# Altium footprint library Shield_PCB_LIB.PcbLib: 10 footprints
Each footprint in its own frame and in the unit in brackets; x right, y up, seen from the top. Pads: shape width x height; smd on the part's side, far side on the other; paste and mask are expansions set on the pad; w line width, h text height; cw(c..) or ccw(c..) is an arc to the next point about the centre after c.
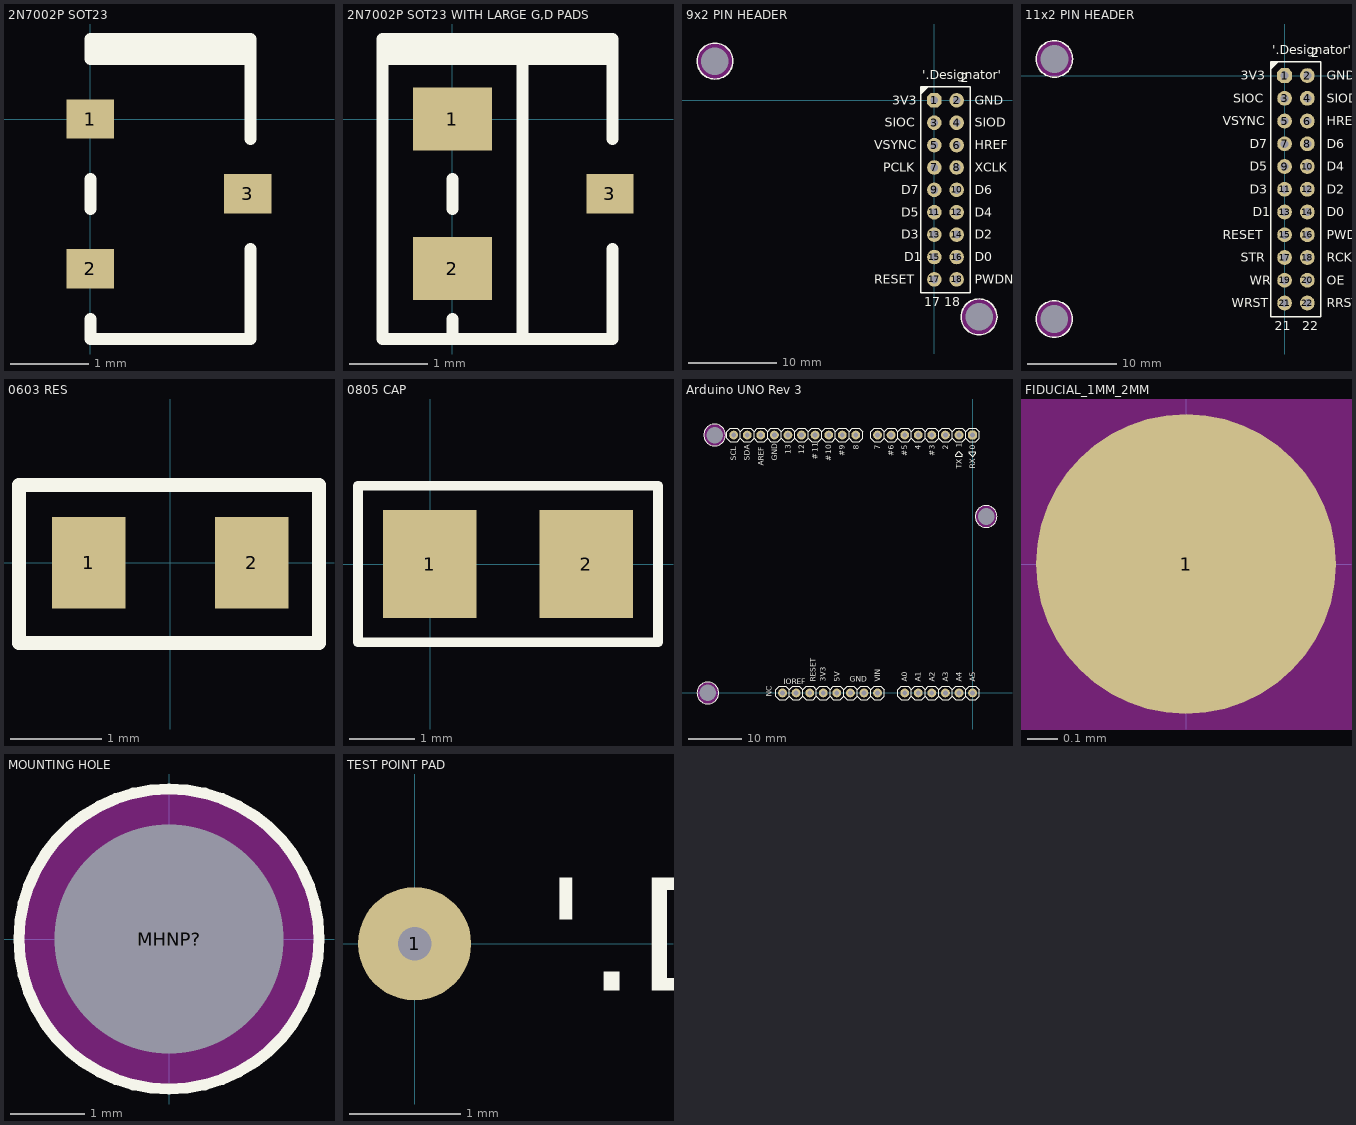
[diagram p0: the footprints below, top view; thin cyan lines are the x and y axes]

## 2N7002P SOT23 [mm] "NMOS 2N7002P in SOT23 package"
pads (3):
  rect 0.6x0.5 smd: 1(0,0) 2(0,-1.9) 3(2,-0.95)
Top Overlay:
  rectangle: 0,0.762 2.032,1.016
  lines w0.1: 0,1.016 0.229,1.016
  lines w0.152: 0,-2.54 0,-2.794 2.032,-2.794 2.032,-1.651 ; 0,-1.143 0,-0.762 ; 2.032,-0.254 2.032,1.016 0,1.016 0,0.762 2.032,0.762
3D body "2N7002P.STEP": height 1.12, standoff 0.01, extent -0.259,-2.44 2.241,0.56

## 2N7002P SOT23 WITH LARGE G,D PADS [mm] "NMOS 2N7002P in SOT23 package"
pads (3):
  rect 1x0.8 smd: 1(0,0) 2(0,-1.9)
  rect 0.6x0.5 smd: 3(2,-0.95)
Top Overlay:
  rectangle: -0.889,0.762 2.032,1.016
  lines w0.1: 0,1.016 0.229,1.016
  lines w0.152: 0,-2.54 0,-2.794 ; 0,-1.143 0,-0.762 ; 0.889,-2.54 0.889,-2.776 0.889,0.762 ; 2.032,-1.651 2.032,-2.794 0,-2.794 ; 2.032,-0.254 2.032,1.016 -0.889,1.016 -0.889,0.762 ; 2.032,0.762 -0.889,0.762 ; -0.889,0.762 -0.889,-2.794 0,-2.794
3D body "2N7002P.STEP": height 1.12, standoff 0.01, extent -0.259,-2.44 2.241,0.56

## 9x2 PIN HEADER [mil] "9x2 pin header THT100mil x 100mil"
pads (22):
  oct 65x65 hole 35: 1(0,0)
  round 65 hole 35: 2(100,0) 3(0,-100) 4(100,-100) 5(0,-200) 6(100,-200) 7(0,-300) 8(100,-300) 9(0,-400) 10(100,-400) 11(0,-500) 12(100,-500) 13(0,-600) 14(100,-600) 15(0,-700) 16(100,-700) 17(0,-800) 18(100,-800)
  round 60 hole 122.05 unplated: MHNP?(-980,175) MHNP?(200.11,-967.19)
  round 80 hole 122.05: ""(-980,175) ""(200.11,-967.19)
Top Overlay:
  circle w6: c-980,175 r80
  circle w6: c200.11,-967.19 r80
  region: -60,30 -30,60 -60,60
  lines w6: -60,30 -30,60 ; -60,30 -60,-860 160,-860 160,60 -30,60 ; -60,30 -60,60 -30,60 ; -60,30 -30,60
  text "GND" at 181,-19 h40
  text "SIOD" at 181,-119 h40
  text "HREF" at 181,-219 h40
  text "XCLK" at 181,-319 h40
  text "D6" at 181,-419 h40
  text "D4" at 181,-519 h40
  text "D2" at 181,-619 h40
  text "D0" at 181,-719 h40
  text "PWDN" at 181,-819 h40
  text "17" at -44,-919 h40
  text "2" at 117.34,81 h40
  text "18" at 44.02,-919 h40
  text "'.Designator'" at -54,94.33 h40
  text "3V3" at -187.63,-19 h40
  text "SIOC" at -220.95,-119 h40
  text "VSYNC" at -267.61,-219 h40
  text "PCLK" at -227.62,-319 h40
  text "D7" at -147.65,-419 h40
  text "D5" at -147.65,-519 h40
  text "D3" at -147.65,-619 h40
  text "D1" at -134.32,-719 h40
  text "RESET" at -267.61,-819 h40
Bottom Overlay:
  circle w6: c-980,175 r80
  circle w6: c200.11,-967.19 r80
  region: -60,30 -30,60 -60,60
  lines w6: -60,30 -60,-860 160,-860 160,60 -30,60 ; -60,30 -30,60 ; -60,30 -60,60 -30,60 ; -60,30 -30,60
  text "17" at 15.98,-919 h40
  text "RESET" at -81,-819 h40
  text "D1" at -81,-719 h40
  text "D3" at -81,-619 h40
  text "D5" at -81,-519 h40
  text "D7" at -81,-419 h40
  text "PCLK" at -75,-325 h40
  text "VSYNC" at -81,-219 h40
  text "SIOC" at -81,-119 h40
  text "3V3" at -81,-19 h40
  text "18" at 104,-919 h40
  text "PWDN" at 327.62,-819 h40
  text "D0" at 247.65,-719 h40
  text "D2" at 247.65,-619 h40
  text "D4" at 247.65,-519 h40
  text "D6" at 247.65,-419 h40
  text "XCLK" at 327.62,-319 h40
  text "HREF" at 327.62,-219 h40
  text "SIOD" at 320.95,-119 h40
  text "GND" at 287.63,-19 h40
  text "2" at 150,75 h40
  text "'.Designator'" at 24,94.33 h40
Keep-Out Layer:
  circle w80: c-980,175 r40
  circle w80: c200.11,-967.19 r40
3D body "OV7670_retraida.STEP": height 1297.83, standoff 81.3, extent -1078.73,-1066.65 299.23,271.94
3D body "FEMALE_THT_9X2_names.stp": height 334.65, standoff -96.46, extent -48.42,-855.84 148.43,54
3D body "User Library-MADA-12.step": height 618.11, standoff -145.67, extent -1069.55,83.45 -888.45,264.55
3D body "User Library-MADA-12.step": height 618.11, standoff -145.67, extent 112.45,-1059.55 293.55,-878.45

## 11x2 PIN HEADER [mil] "11x2 pin header THT100mil x 100mil"
pads (26):
  oct 65x65 hole 35: 1(0,0)
  round 65 hole 35: 2(100,0) 3(0,-100) 4(100,-100) 5(0,-200) 6(100,-200) 7(0,-300) 8(100,-300) 9(0,-400) 10(100,-400) 11(0,-500) 12(100,-500) 13(0,-600) 14(100,-600) 15(0,-700) 16(100,-700) 17(0,-800) 18(100,-800) 19(0,-900) 20(100,-900) 21(0,-1000) 22(100,-1000)
  round 60 hole 122.05 unplated: MHNP?(-1012.89,-1070.19) MHNP?(-1012,73)
  round 80 hole 122.05 unplated: ""(-1012.89,-1070.19) ""(-1012,73)
Top Overlay:
  circle w6: c-1012,73 r80
  circle w6: c-1012.89,-1070.19 r80
  region: -60,30 -30,60 -60,60
  lines w6: -60,30 -60,-1060 160,-1060 160,60 -30,60 ; -60,30 -30,60 ; -60,30 -60,60 -30,60
  text "'.Designator'" at -54,94.33 h40
  text "22" at 77.35,-1119 h40
  text "21" at -44,-1119 h40
  text "STR" at -192.63,-819 h40
  text "WRST" at -232.62,-1019 h40
  text "RRST" at 186,-1019 h40
  text "OE" at 186,-919 h40
  text "RESET" at -272.61,-719 h40
  text "D2" at 186,-519 h40
  text "D0" at 186,-619 h40
  text "WR" at -152.65,-919 h40
  text "D3" at -152.65,-519 h40
  text "D1" at -139.32,-619 h40
  text "RCK" at 186,-819 h40
  text "PWDN" at 186,-719 h40
  text "D6" at 186,-319 h40
  text "D4" at 186,-419 h40
  text "D5" at -152.65,-419 h40
  text "D7" at -152.65,-319 h40
  text "VSYNC" at -272.61,-219 h40
  text "HREF" at 186,-219 h40
  text "SIOC" at -225.95,-119 h40
  text "GND" at 186,-19 h40
  text "SIOD" at 186,-119 h40
  text "3V3" at -192.63,-19 h40
  text "2" at 117.34,81 h40
Bottom Overlay:
  circle w6: c-1012,73 r80
  circle w6: c-1012.89,-1070.19 r80
  region: -60,30 -30,60 -60,60
  lines w6: -60,30 -60,-1060 160,-1060 160,60 -30,60 ; -60,30 -60,60 -30,60 ; -60,30 -30,60
  text "'.Designator'" at 24,94.33 h40
  text "21" at 9.32,-1119 h40
  text "D3" at -86,-519 h40
  text "WRST" at -86,-1019 h40
  text "WR" at -86,-919 h40
  text "STR" at -86,-819 h40
  text "RESET" at -86,-719 h40
  text "D1" at -86,-619 h40
  text "D5" at -86,-419 h40
  text "D7" at -86,-319 h40
  text "VSYNC" at -86,-219 h40
  text "SIOC" at -86,-119 h40
  text "3V3" at -86,-19 h40
  text "22" at 144,-1119 h40
  text "RRST" at 332.62,-1019 h40
  text "D4" at 252.65,-419 h40
  text "OE" at 252.65,-919 h40
  text "RCK" at 292.63,-819 h40
  text "PWDN" at 332.62,-719 h40
  text "D0" at 252.65,-619 h40
  text "D2" at 252.65,-519 h40
  text "D6" at 252.65,-319 h40
  text "HREF" at 332.62,-219 h40
  text "2" at 144,81 h40
  text "SIOD" at 325.95,-119 h40
  text "GND" at 292.63,-19 h40
Keep-Out Layer:
  circle w80: c-1012,73 r40
  circle w80: c-1012.89,-1070.19 r40
3D body "User Library-MADA-12.step": height 618.11, standoff -145.67, extent -1099.55,-1160.55 -918.45,-979.45
3D body "User Library-MADA-12.step": height 618.11, standoff -145.67, extent -1100.55,-17.55 -919.45,163.55
3D body "FEMALE_THT_11X2_Names.STEP": height 334.65, standoff -96.46, extent -49.42,-1053.92 147.44,55.92
3D body "OV7670 FIFO BUFFER name.STEP": height 1534.38, standoff 81.62, extent -1109.98,-1169 267.97,169.59

## 0603 RES [mm]
pads (2):
  rect 0.8x1 smd: 1(-0.889,0) 2(0.889,0)
Top Overlay:
  lines w0.152: -1.651,-0.876 -1.651,0.849 1.624,0.849 1.624,-0.876 -1.651,-0.876
3D body "0603_RES.STEP": height 0.8, standoff 0, extent -1.23,-0.4 1.23,0.4

## 0805 CAP [mm]
pads (2):
  rect 1.44x1.66 smd: 1(-0.007,0) 2(2.393,0)
Top Overlay:
  lines w0.152: -1.107,-1.2 3.493,-1.2 3.493,1.2 -1.107,1.2 -1.107,-1.2
3D body "0805_CAP_3.stp": height 1, standoff 0, extent 0.05,-0.775 2.35,0.775

## Arduino UNO Rev 3 [mil] "Arduino UNO Rev 3 pinout as pads V2"
pads (35):
  round 65 hole 35: 3V3(-1100,0) 5V(-1000,0) A0(-500,0) A1(-400,0) A2(-300,0) A3(-200,0) A4/SDA(-1660,1900) A4/SDA(-100,0) A5/SCL(-1760,1900) A5/SCL(0,0) AREF(-1560,1900) D1(-100,1900) D2(-200,1900) D3(-300,1900) D4(-400,1900) D5(-500,1900) D6(-600,1900) D7(-700,1900) D8(-860,1900) D9(-960,1900) D10(-1060,1900) D11(-1160,1900) D12(-1260,1900) D13(-1360,1900) GND(-1460,1900) GND(-900,0) GND(-800,0) IOREF(-1300,0) NC(-1400,0) RESET(-1200,0) VIN(-700,0)
  oct 65x65 hole 35: D0(0,1900)
  round 60 hole 122.05 unplated: MH1(-1950,0) MH2(-1900,1900) MH3(100,1300)
Top Overlay:
  drawing of 244 lines, arcs and shapes, not listed
  text "RESET" at -1155.01,81 h40
  text "TX" at -80,1652.35 h40
  text "SCL" at -1739.99,1712.35 h40
  text "SDA" at -1640.01,1712.37 h40
  text "NC" at -1479.99,-29 h40
  text "IOREF" at -1389.97,66 h40
  text "5V" at -980,80.99 h40
  text "A0" at -480,80.99 h40
  text "AREF" at -1540,1672.37 h40
  text "GND" at -1440.01,1712.37 h40
  text "RX" at 19.99,1652.35 h40
  text "3V3" at -1080.01,81 h40
  text "A1" at -380,80.99 h40
  text "A2" at -280,80.99 h40
  text "A3" at -180,80.99 h40
  text "A4" at -80,80.99 h40
  text "A5" at 19.99,81 h40
  text "VIN" at -680,80.99 h40
  text "GND" at -903.32,81 h40
  text "#" at -1140.01,1717.34 h40
  text "#" at -1040.01,1707.34 h40
  text "#" at -480.01,1742.34 h40
  text "#" at -279.99,1742.32 h40
  text "#" at -580.01,1742.34 h40
  text "13" at -1340.01,1759.02 h40
  text "12" at -1240.01,1759.02 h40
  text "11" at -1140.01,1772.35 h40
  text "10" at -1040.01,1759.02 h40
  text "9" at -940.01,1792.34 h40
  text "8" at -840.01,1792.34 h40
  text "7" at -680.01,1792.34 h40
  text "6" at -580.01,1792.34 h40
  text "5" at -480.01,1792.34 h40
  text "4" at -380.01,1792.34 h40
  text "3" at -280.01,1792.34 h40
  text "2" at -179.99,1792.32 h40
  text "1" at -80.01,1805.67 h40
  text "0" at 19.99,1792.34 h40
  text "#" at -940.01,1742.34 h40
Bottom Overlay:
  drawing of 244 lines, arcs and shapes, not listed
  text "1" at -80.01,1819 h40
  text "0" at 19.99,1819 h40
  text "2" at -180.01,1819 h40
  text "3" at -280.01,1819 h40
  text "6" at -580.01,1819 h40
  text "4" at -380.01,1819 h40
  text "7" at -680.01,1819 h40
  text "5" at -480.01,1819 h40
  text "#" at -280.01,1769 h40
  text "#" at -480.01,1769 h40
  text "#" at -580.01,1769 h40
  text "RX" at 19.99,1719 h40
  text "TX" at -80,1718.99 h40
  text "A5" at 19.99,147.65 h40
  text "A3" at -180,147.64 h40
  text "A4" at -80,147.64 h40
  text "VIN" at -680,180.96 h40
  text "A2" at -280,147.64 h40
  text "A0" at -480,147.64 h40
  text "A1" at -380,134.31 h40
  text "9" at -939.99,1818.98 h40
  text "8" at -839.99,1818.98 h40
  text "11" at -1139.99,1818.98 h40
  text "10" at -1039.99,1818.98 h40
  text "#" at -939.99,1768.98 h40
  text "#" at -1039.99,1733.98 h40
  text "#" at -1139.99,1743.98 h40
  text "RESET" at -1155.01,267.61 h40
  text "12" at -1239.99,1818.98 h40
  text "13" at -1339.99,1818.98 h40
  text "SDA" at -1640.01,1819 h40
  text "SCL" at -1740.01,1819 h40
  text "AREF" at -1540,1818.99 h40
  text "IOREF" at -1210.03,66 h40
  text "5V" at -980,147.64 h40
  text "GND" at -796.68,81 h40
  text "3V3" at -1080.01,187.63 h40
  text "NC" at -1480,37.64 h40
  text "GND" at -1439.99,1818.98 h40
Keep-Out Layer:
  circle w80: c100,1300 r40
  circle w80: c-1950,0 r40
  circle w80: c-1900,1900 r40
Mechanical 3:
  region: -1750,1910 -1750,1890 -1770,1890 -1770,1910
  region: -1650,1910 -1650,1890 -1670,1890 -1670,1910
  region: -1310,-10 -1310,10 -1290,10 -1290,-10
  region: -1410,-10 -1410,10 -1390,10 -1390,-10
  region: -690,1910 -690,1890 -710,1890 -710,1910
  region: 10,1910 10,1890 -10,1890 -10,1910
  region: -90,1910 -90,1890 -110,1890 -110,1910
  region: -190,1910 -190,1890 -210,1890 -210,1910
  region: -290,1910 -290,1890 -310,1890 -310,1910
  region: -390,1910 -390,1890 -410,1890 -410,1910
  region: -490,1910 -490,1890 -510,1890 -510,1910
  region: -590,1910 -590,1890 -610,1890 -610,1910
  region: -1550,1910 -1550,1890 -1570,1890 -1570,1910
  region: -850,1910 -850,1890 -870,1890 -870,1910
  region: -950,1910 -950,1890 -970,1890 -970,1910
  region: -1050,1910 -1050,1890 -1070,1890 -1070,1910
  region: -1150,1910 -1150,1890 -1170,1890 -1170,1910
  region: -1250,1910 -1250,1890 -1270,1890 -1270,1910
  region: -1350,1910 -1350,1890 -1370,1890 -1370,1910
  region: -1450,1910 -1450,1890 -1470,1890 -1470,1910
  region: -110,-10 -110,10 -90,10 -90,-10
  region: -210,-10 -210,10 -190,10 -190,-10
  region: -310,-10 -310,10 -290,10 -290,-10
  region: -410,-10 -410,10 -390,10 -390,-10
  region: -510,-10 -510,10 -490,10 -490,-10
  region: -10,-10 -10,10 10,10 10,-10
  region: -810,-10 -810,10 -790,10 -790,-10
  region: -910,-10 -910,10 -890,10 -890,-10
  region: -1010,-10 -1010,10 -990,10 -990,-10
  region: -1110,-10 -1110,10 -1090,10 -1090,-10
  region: -1210,-10 -1210,10 -1190,10 -1190,-10
  region: -710,-10 -710,10 -690,10 -690,-10
3D body "6PIN.SLDPRT": height 57, standoff -383, extent -546.04,-46 45,46
3D body "8PIN.SLDPRT": height 57, standoff -383, extent -1446.26,-46 -655,46
3D body "8PIN.SLDPRT": height 57, standoff -383, extent -746.26,1854 45,1946
3D body "10PIN.SLDPRT": height 57, standoff -383, extent -1806.61,1854 -815,1946
3D body "ARDUINO_UNO_R3_1.STEP": height -108.27, standoff -708.66, extent -2750,-100 200,2000
3D body "User Library-MADA-12.step": height 80.71, standoff -683.07, extent 9.45,1209.45 190.55,1390.55
3D body "User Library-MADA-12.step": height 80.71, standoff -683.07, extent -1990.55,1809.45 -1809.45,1990.55
3D body "User Library-MADA-12.step": height 80.71, standoff -683.07, extent -2040.55,-90.55 -1859.45,90.55

## FIDUCIAL_1MM_2MM [mm]
pads (1):
  round 1 smd mask+0.5: 1(0,0)
Top Layer keep-out:
  circle w1: c0,0 r0.5

## MOUNTING HOLE [mil]
pads (1):
  round 60 hole 122.05 unplated: MHNP?(0,0)
Top Overlay:
  circle w6: c0,0 r80
Bottom Overlay:
  circle w6: c0,0 r80
Keep-Out Layer:
  circle w80: c0,0 r40

## TEST POINT PAD [mil]
pads (1):
  round 40 hole 11.8: 1(0,0)
Top Overlay:
  text "'.Designator'" at 46,-16.66 h40
Bottom Overlay:
  text "'.Designator'" at 499.19,-16.66 h40